# Altium footprint library NXP_60_26022015.PCBLIB: 287 footprints (part 13 of 18)
Each footprint in its own frame and in the unit in brackets; x right, y up, seen from the top. Pads: shape width x height; smd on the part's side, far side on the other; paste and mask are expansions set on the pad; w line width, h text height; cw(c..) or ccw(c..) is an arc to the next point about the centre after c.
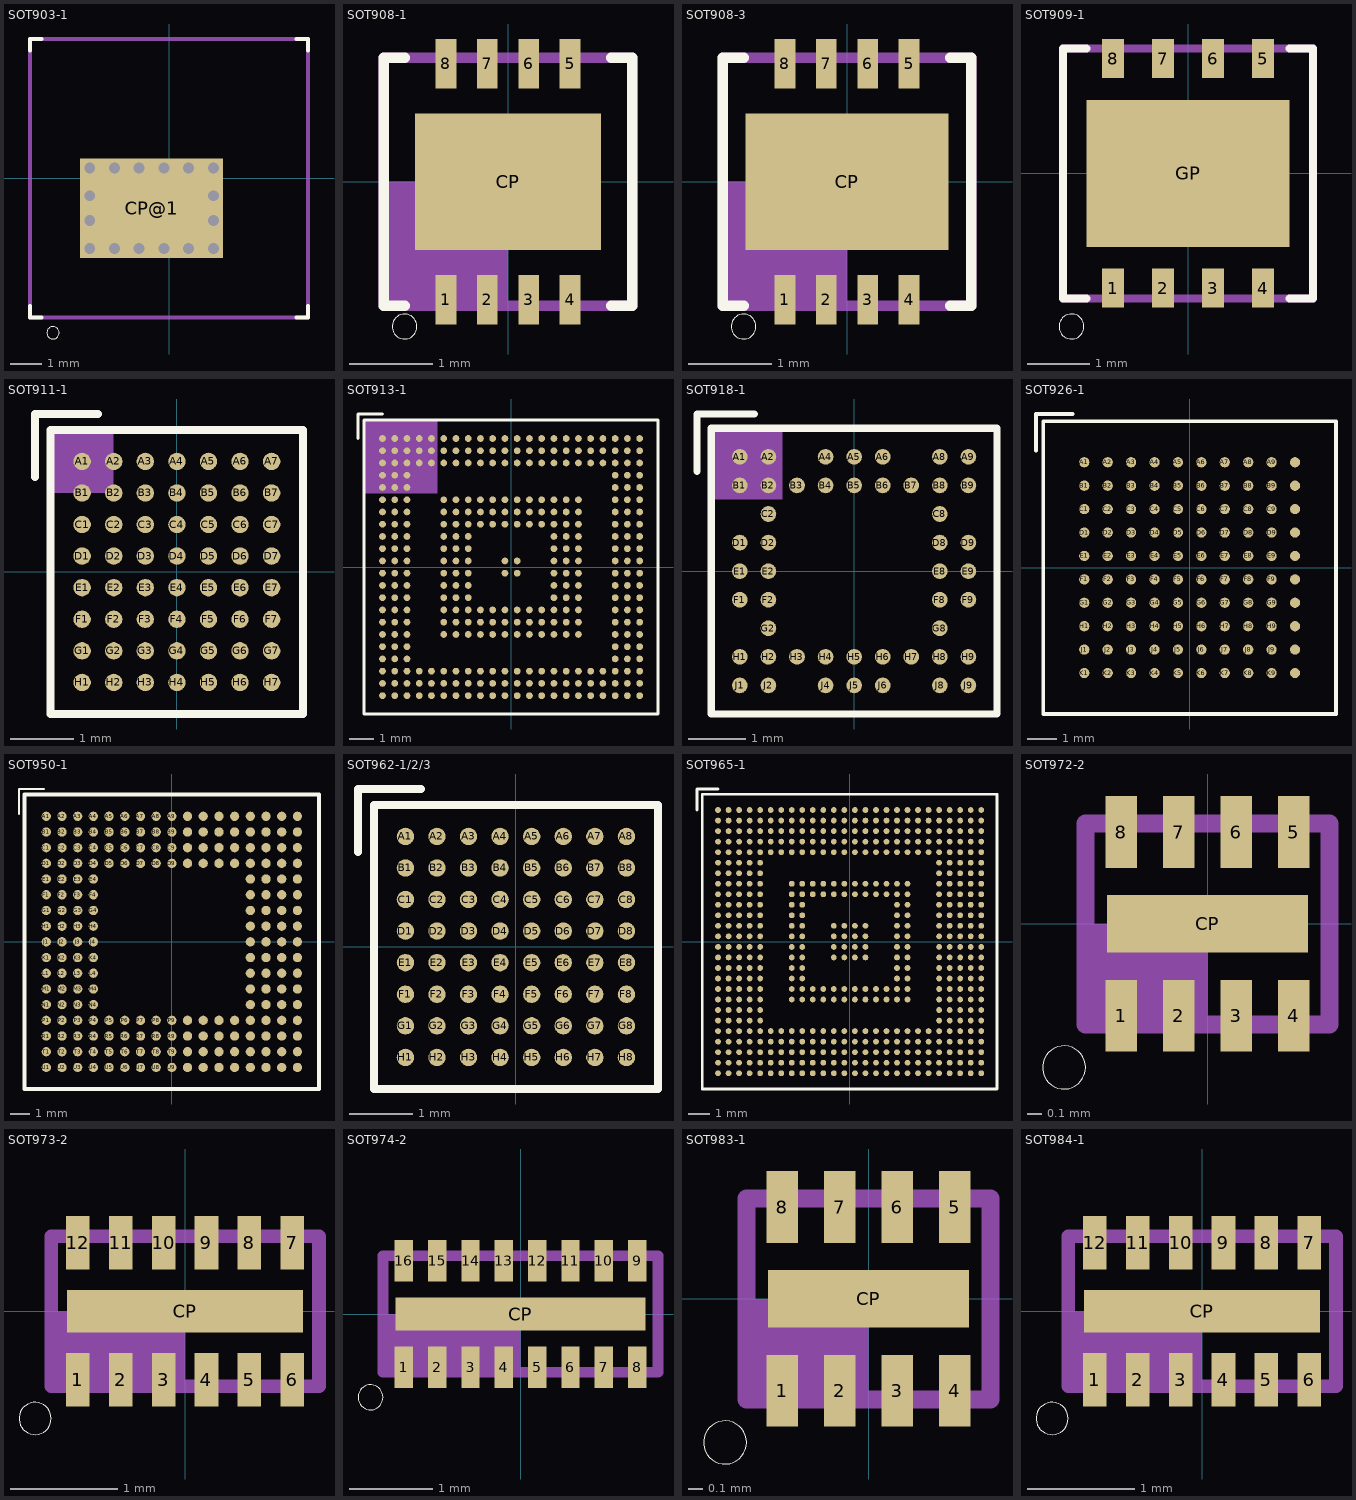
[diagram p12: the footprints below, top view; thin cyan lines are the x and y axes]

## SOT903-1 [mm]
pads (81):
  rect 0x0 smd: 1(-3.75,-4.25) 2(-3.25,-4.25) 3(-2.75,-4.25) 4(-2.25,-4.25) 5(-1.75,-4.25) 6(-1.25,-4.25) 7(-0.75,-4.25) 8(-0.25,-4.25) 9(0.25,-4.25) 10(0.75,-4.25) 11(1.25,-4.25) 12(1.75,-4.25) 13(2.25,-4.25) 14(2.75,-4.25) 15(3.25,-4.25) 16(3.75,-4.25) 17(4.25,-3.75) 18(4.25,-3.25) 19(4.25,-2.75) 20(4.25,-2.25) 21(4.25,-1.75) 22(4.25,-1.25) 23(4.25,-0.75) 24(4.25,-0.25) 25(4.25,0.25) 26(4.25,0.75) 27(4.25,1.25) 28(4.25,1.75) 29(4.25,2.25) 30(4.25,2.75) 31(4.25,3.25) 32(4.25,3.75) 33(3.75,4.25) 34(3.25,4.25) 35(2.75,4.25) 36(2.25,4.25) 37(1.75,4.25) 38(1.25,4.25) 39(0.75,4.25) 40(0.25,4.25) 41(-0.25,4.25) 42(-0.75,4.25) 43(-1.25,4.25) 44(-1.75,4.25) 45(-2.25,4.25) 46(-2.75,4.25) 47(-3.25,4.25) 48(-3.75,4.25) 49(-4.25,3.75) 50(-4.25,3.25) 51(-4.25,2.75) 52(-4.25,2.25) 53(-4.25,1.75) 54(-4.25,1.25) 55(-4.25,0.75) 56(-4.25,0.25) 57(-4.25,-0.25) 58(-4.25,-0.75) 59(-4.25,-1.25) 60(-4.25,-1.75) 61(-4.25,-2.25) 62(-4.25,-2.75) 63(-4.25,-3.25) 64(-4.25,-3.75)
  rect 4.61x3.22 smd: CP@1(-0.565,-0.97)
  round 0.5 hole 0.35: CP@2(1.435,-0.57) CP@3(1.435,-1.37) CP@4(1.435,-2.27) CP@5(1.435,0.33) CP@6(-2.565,-0.57) CP@7(-2.565,-1.37) CP@8(-2.565,-2.27) CP@9(-2.565,0.33) CP@10(-1.765,0.33) CP@11(-0.965,0.33) CP@12(-0.165,0.33) CP@13(0.635,0.33) CP@14(-1.765,-2.27) CP@15(-0.965,-2.27) CP@16(-0.165,-2.27) CP@17(0.635,-2.27)
Top Layer:
  region: 0,0 0.254,0 0.254,0.254 0,0.254
  region: 0,0 0.254,0 0.254,0.254 0,0.254
  region: 0,0 0.254,0 0.254,0.254 0,0.254
  region: 0,0 0.254,0 0.254,0.254 0,0.254
  region: 0,0 0.254,0 0.254,0.254 0,0.254
  region: 0,0 0.254,0 0.254,0.254 0,0.254
  region: 0,0 0.254,0 0.254,0.254 0,0.254
  region: 0,0 0.254,0 0.254,0.254 0,0.254
  region: 0,0 0.254,0 0.254,0.254 0,0.254
  region: 0,0 0.254,0 0.254,0.254 0,0.254
  region: 0,0 0.254,0 0.254,0.254 0,0.254
  region: 0,0 0.254,0 0.254,0.254 0,0.254
  region: 0,0 0.254,0 0.254,0.254 0,0.254
  region: 0,0 0.254,0 0.254,0.254 0,0.254
  region: 0,0 0.254,0 0.254,0.254 0,0.254
  region: 0,0 0.254,0 0.254,0.254 0,0.254
  region: 0,0 0.254,0 0.254,0.254 0,0.254
  region: 0,0 0.254,0 0.254,0.254 0,0.254
  region: 0,0 0.254,0 0.254,0.254 0,0.254
  region: 0,0 0.254,0 0.254,0.254 0,0.254
  region: 0,0 0.254,0 0.254,0.254 0,0.254
  region: 0,0 0.254,0 0.254,0.254 0,0.254
  region: 0,0 0.254,0 0.254,0.254 0,0.254
  region: 0,0 0.254,0 0.254,0.254 0,0.254
  region: 0,0 0.254,0 0.254,0.254 0,0.254
  region: 0,0 0.254,0 0.254,0.254 0,0.254
  region: 0,0 0.254,0 0.254,0.254 0,0.254
  region: 0,0 0.254,0 0.254,0.254 0,0.254
  region: 0,0 0.254,0 0.254,0.254 0,0.254
  region: 0,0 0.254,0 0.254,0.254 0,0.254
  region: 0,0 0.254,0 0.254,0.254 0,0.254
  region: 0,0 0.254,0 0.254,0.254 0,0.254
  region: 0,0 0.254,0 0.254,0.254 0,0.254
  region: 0,0 0.254,0 0.254,0.254 0,0.254
  region: 0,0 0.254,0 0.254,0.254 0,0.254
  region: 0,0 0.254,0 0.254,0.254 0,0.254
  region: 0,0 0.254,0 0.254,0.254 0,0.254
  region: 0,0 0.254,0 0.254,0.254 0,0.254
  region: 0,0 0.254,0 0.254,0.254 0,0.254
  region: 0,0 0.254,0 0.254,0.254 0,0.254
  region: 0,0 0.254,0 0.254,0.254 0,0.254
  region: 0,0 0.254,0 0.254,0.254 0,0.254
  region: 0,0 0.254,0 0.254,0.254 0,0.254
  region: 0,0 0.254,0 0.254,0.254 0,0.254
  region: 0,0 0.254,0 0.254,0.254 0,0.254
  region: 0,0 0.254,0 0.254,0.254 0,0.254
  region: 0,0 0.254,0 0.254,0.254 0,0.254
  region: 0,0 0.254,0 0.254,0.254 0,0.254
  region: 0,0 0.254,0 0.254,0.254 0,0.254
  region: 0,0 0.254,0 0.254,0.254 0,0.254
  region: 0,0 0.254,0 0.254,0.254 0,0.254
  region: 0,0 0.254,0 0.254,0.254 0,0.254
  region: 0,0 0.254,0 0.254,0.254 0,0.254
  region: 0,0 0.254,0 0.254,0.254 0,0.254
  region: 0,0 0.254,0 0.254,0.254 0,0.254
  region: 0,0 0.254,0 0.254,0.254 0,0.254
  region: 0,0 0.254,0 0.254,0.254 0,0.254
  region: 0,0 0.254,0 0.254,0.254 0,0.254
  region: 0,0 0.254,0 0.254,0.254 0,0.254
  region: 0,0 0.254,0 0.254,0.254 0,0.254
  region: 0,0 0.254,0 0.254,0.254 0,0.254
  region: 0,0 0.254,0 0.254,0.254 0,0.254
  region: 0,0 0.254,0 0.254,0.254 0,0.254
  region: 0,0 0.254,0 0.254,0.254 0,0.254
Top Overlay:
  circle w0: c-3.75,-5 r0.2
  lines w0.127: -4.5,-4.125 -4.5,-4.5 -4.125,-4.5 ; -4.5,4.125 -4.5,4.5 -4.125,4.5 ; 4.125,-4.5 4.5,-4.5 4.5,-4.125 ; 4.125,4.5 4.5,4.5 4.5,4.125
Top Paste:
  drawing of 70 lines, arcs and shapes, not listed
Top Solder:
  drawing of 65 lines, arcs and shapes, not listed
Mechanical 16:
  lines w0.127: -4.5,-4.5 4.5,-4.5 4.5,4.5 -4.5,4.5 -4.5,-4.5

## SOT908-1 [mm]
pads (9):
  rect 0.25x0.6 smd: 1(-0.75,-1.425) 2(-0.25,-1.425) 3(0.25,-1.425) 4(0.75,-1.425) 5(0.75,1.425) 6(0.25,1.425) 7(-0.25,1.425) 8(-0.75,1.425)
  rect 2.25x1.65 smd: CP(0,0)
Top Overlay:
  circle w0: c-1.25,-1.75 r0.15
  lines w0.127: -1.25,-1.5 -1.5,-1.5 -1.5,1.5 -1.25,1.5 ; 1.25,-1.5 1.5,-1.5 1.5,1.5 1.25,1.5
Top Paste:
  rectangle: -0.55,-0.325 0.55,0.325
Mechanical 16:
  rectangle: -1.5,-1.5 0,0
  lines w0.127: -1.5,-1.5 1.5,-1.5 1.5,1.5 -1.5,1.5 -1.5,-1.5

## SOT908-3 [mm]
pads (9):
  rect 0.25x0.6 smd: 1(-0.75,-1.425) 2(-0.25,-1.425) 3(0.25,-1.425) 4(0.75,-1.425) 5(0.75,1.425) 6(0.25,1.425) 7(-0.25,1.425) 8(-0.75,1.425)
  rect 2.45x1.65 smd: CP(0,0)
Top Overlay:
  circle w0: c-1.25,-1.75 r0.15
  lines w0.127: -1.25,-1.5 -1.5,-1.5 -1.5,1.5 -1.25,1.5 ; 1.25,-1.5 1.5,-1.5 1.5,1.5 1.25,1.5
Top Paste:
  rectangle: -0.55,-0.325 0.55,0.325
Mechanical 16:
  rectangle: -1.5,-1.5 0,0
  lines w0.127: -1.5,-1.5 1.5,-1.5 1.5,1.5 -1.5,1.5 -1.5,-1.5

## SOT909-1 [mm]
pads (9):
  rect 0.35x0.625 smd: 1(-1.2,-1.837) 2(-0.4,-1.837) 3(0.4,-1.837) 4(1.2,-1.837) 5(1.2,1.837) 6(0.4,1.837) 7(-0.4,1.837) 8(-1.2,1.837)
  rect 3.25x2.35 smd: GP(0,0)
Top Overlay:
  circle w0: c-1.865,-2.45 r0.2
  lines w0.127: -1.625,-2 -2,-2 -2,2 -1.625,2 ; 1.625,-2 2,-2 2,2 1.625,2
Top Paste:
  rectangle: 0.175,-0.55 0.875,0.55
  rectangle: -0.875,-0.55 -0.175,0.55
Mechanical 16:
  lines w0.127: -2,-2 2,-2 ; -2,2 2,2
  text "SOT909-1" at -0.5,-1.125 h0.17

## SOT911-1 [mm]
pads (56):
  rrect100% 0.275x0.275 smd: A1(-1.5,1.75) A2(-1,1.75) A3(-0.5,1.75) A4(0,1.75) A5(0.5,1.75) A6(1,1.75) A7(1.5,1.75) B1(-1.5,1.25) B2(-1,1.25) B3(-0.5,1.25) B4(0,1.25) B5(0.5,1.25) B6(1,1.25) B7(1.5,1.25) C1(-1.5,0.75) C2(-1,0.75) C3(-0.5,0.75) C4(0,0.75) C5(0.5,0.75) C6(1,0.75) C7(1.5,0.75) D1(-1.5,0.25) D2(-1,0.25) D3(-0.5,0.25) D4(0,0.25) D5(0.5,0.25) D6(1,0.25) D7(1.5,0.25) E1(-1.5,-0.25) E2(-1,-0.25) E3(-0.5,-0.25) E4(0,-0.25) E5(0.5,-0.25) E6(1,-0.25) E7(1.5,-0.25) F1(-1.5,-0.75) F2(-1,-0.75) F3(-0.5,-0.75) F4(0,-0.75) F5(0.5,-0.75) F6(1,-0.75) F7(1.5,-0.75) G1(-1.5,-1.25) G2(-1,-1.25) G3(-0.5,-1.25) G4(0,-1.25) G5(0.5,-1.25) G6(1,-1.25) G7(1.5,-1.25) H1(-1.5,-1.75) H2(-1,-1.75) H3(-0.5,-1.75) H4(0,-1.75) H5(0.5,-1.75) H6(1,-1.75) H7(1.5,-1.75)
Top Overlay:
  lines w0.127: -2.25,1.5 -2.25,2.5 -1.25,2.5 ; -2,-2.25 -2,2.25 2,2.25 2,-2.25 -2,-2.25
Top Paste:
  rectangle: -1.65,1.6 -1.35,1.9
  rectangle: -1.65,1.1 -1.35,1.4
  rectangle: -1.65,0.6 -1.35,0.9
  rectangle: -1.65,0.1 -1.35,0.4
  rectangle: -1.65,-0.4 -1.35,-0.1
  rectangle: -1.65,-0.9 -1.35,-0.6
  rectangle: -1.65,-1.4 -1.35,-1.1
  rectangle: -1.65,-1.9 -1.35,-1.6
  rectangle: -1.15,1.6 -0.85,1.9
  rectangle: -1.15,1.1 -0.85,1.4
  rectangle: -1.15,0.6 -0.85,0.9
  rectangle: -1.15,0.1 -0.85,0.4
  rectangle: -1.15,-0.4 -0.85,-0.1
  rectangle: -1.15,-0.9 -0.85,-0.6
  rectangle: -1.15,-1.4 -0.85,-1.1
  rectangle: -1.15,-1.9 -0.85,-1.6
  rectangle: -0.65,1.6 -0.35,1.9
  rectangle: -0.65,1.1 -0.35,1.4
  rectangle: -0.65,0.6 -0.35,0.9
  rectangle: -0.65,0.1 -0.35,0.4
  rectangle: -0.65,-0.4 -0.35,-0.1
  rectangle: -0.15,1.6 0.15,1.9
  rectangle: -0.15,1.1 0.15,1.4
  rectangle: -0.15,0.6 0.15,0.9
  rectangle: -0.15,0.1 0.15,0.4
  rectangle: 0.35,1.6 0.65,1.9
  rectangle: 0.35,1.1 0.65,1.4
  rectangle: 0.35,0.6 0.65,0.9
  rectangle: 0.35,0.1 0.65,0.4
  rectangle: -0.15,-0.4 0.15,-0.1
  rectangle: 0.35,-0.4 0.65,-0.1
  rectangle: -0.65,-0.9 -0.35,-0.6
  rectangle: -0.65,-1.4 -0.35,-1.1
  rectangle: -0.65,-1.9 -0.35,-1.6
  rectangle: -0.15,-0.9 0.15,-0.6
  rectangle: -0.15,-1.4 0.15,-1.1
  rectangle: -0.15,-1.9 0.15,-1.6
  rectangle: 0.35,-0.9 0.65,-0.6
  rectangle: 0.35,-1.4 0.65,-1.1
  rectangle: 0.35,-1.9 0.65,-1.6
  rectangle: 0.85,1.6 1.15,1.9
  rectangle: 0.85,1.1 1.15,1.4
  rectangle: 0.85,0.6 1.15,0.9
  rectangle: 0.85,0.1 1.15,0.4
  rectangle: 0.85,-0.4 1.15,-0.1
  rectangle: 0.85,-0.9 1.15,-0.6
  rectangle: 0.85,-1.4 1.15,-1.1
  rectangle: 0.85,-1.9 1.15,-1.6
  rectangle: 1.35,1.6 1.65,1.9
  rectangle: 1.35,1.1 1.65,1.4
  rectangle: 1.35,0.6 1.65,0.9
  rectangle: 1.35,0.1 1.65,0.4
  rectangle: 1.35,-0.4 1.65,-0.1
  rectangle: 1.35,-0.9 1.65,-0.6
  rectangle: 1.35,-1.4 1.65,-1.1
  rectangle: 1.35,-1.9 1.65,-1.6
Top Solder:
  circle w0: c-1.5,1.75 r0.213
  circle w0: c-1.5,1.25 r0.213
  circle w0: c-1.5,0.75 r0.213
  circle w0: c-1.5,0.25 r0.213
  circle w0: c-1.5,-0.25 r0.213
  circle w0: c-1.5,-0.75 r0.213
  circle w0: c-1.5,-1.25 r0.213
  circle w0: c-1.5,-1.75 r0.213
  circle w0: c-1,1.75 r0.213
  circle w0: c-1,1.25 r0.213
  circle w0: c-1,0.75 r0.213
  circle w0: c-1,0.25 r0.213
  circle w0: c-1,-0.25 r0.213
  circle w0: c-1,-0.75 r0.213
  circle w0: c-1,-1.25 r0.213
  circle w0: c-1,-1.75 r0.213
  circle w0: c-0.5,1.75 r0.213
  circle w0: c-0.5,1.25 r0.213
  circle w0: c-0.5,0.75 r0.213
  circle w0: c-0.5,0.25 r0.213
  circle w0: c-0.5,-0.25 r0.213
  circle w0: c0,1.75 r0.213
  circle w0: c0,1.25 r0.213
  circle w0: c0,0.75 r0.213
  circle w0: c0,0.25 r0.213
  circle w0: c0.5,1.75 r0.213
  circle w0: c0.5,1.25 r0.213
  circle w0: c0.5,0.75 r0.213
  circle w0: c0.5,0.25 r0.213
  circle w0: c0,-0.25 r0.213
  circle w0: c0.5,-0.25 r0.213
  circle w0: c-0.5,-0.75 r0.213
  circle w0: c-0.5,-1.25 r0.213
  circle w0: c-0.5,-1.75 r0.213
  circle w0: c0,-0.75 r0.213
  circle w0: c0,-1.25 r0.213
  circle w0: c0,-1.75 r0.213
  circle w0: c0.5,-0.75 r0.213
  circle w0: c0.5,-1.25 r0.213
  circle w0: c0.5,-1.75 r0.213
  circle w0: c1,1.75 r0.213
  circle w0: c1,1.25 r0.213
  circle w0: c1,0.75 r0.213
  circle w0: c1,0.25 r0.213
  circle w0: c1,-0.25 r0.213
  circle w0: c1,-0.75 r0.213
  circle w0: c1,-1.25 r0.213
  circle w0: c1,-1.75 r0.213
  circle w0: c1.5,1.75 r0.213
  circle w0: c1.5,1.25 r0.213
  circle w0: c1.5,0.75 r0.213
  circle w0: c1.5,0.25 r0.213
  circle w0: c1.5,-0.25 r0.213
  circle w0: c1.5,-0.75 r0.213
  circle w0: c1.5,-1.25 r0.213
  circle w0: c1.5,-1.75 r0.213
Mechanical 16:
  rectangle: -2,1.25 -1,2.25

## SOT913-1 [mm]
pads (340):
  rrect100% 0.275x0.275 smd: A1(-5.25,5.25) A2(-4.75,5.25) A3(-4.25,5.25) A4(-3.75,5.25) A5(-3.25,5.25) A6(-2.75,5.25) A7(-2.25,5.25) A8(-1.75,5.25) A9(-1.25,5.25) A10(-0.75,5.25) A11(-0.25,5.25) A12(0.25,5.25) A13(0.75,5.25) A14(1.25,5.25) A15(1.75,5.25) A16(2.25,5.25) A17(2.75,5.25) A18(3.25,5.25) A19(3.75,5.25) A20(4.25,5.25) A21(4.75,5.25) A22(5.25,5.25) AA1(-5.25,-4.75) AA2(-4.75,-4.75) AA3(-4.25,-4.75) AA4(-3.75,-4.75) AA5(-3.25,-4.75) AA6(-2.75,-4.75) AA7(-2.25,-4.75) AA8(-1.75,-4.75) AA9(-1.25,-4.75) AA10(-0.75,-4.75) AA11(-0.25,-4.75) AA12(0.25,-4.75) AA13(0.75,-4.75) AA14(1.25,-4.75) AA15(1.75,-4.75) AA16(2.25,-4.75) AA17(2.75,-4.75) AA18(3.25,-4.75) AA19(3.75,-4.75) AA20(4.25,-4.75) AA21(4.75,-4.75) AA22(5.25,-4.75) AB1(-5.25,-5.25) AB2(-4.75,-5.25) AB3(-4.25,-5.25) AB4(-3.75,-5.25) AB5(-3.25,-5.25) AB6(-2.75,-5.25) AB7(-2.25,-5.25) AB8(-1.75,-5.25) AB9(-1.25,-5.25) AB10(-0.75,-5.25) AB11(-0.25,-5.25) AB12(0.25,-5.25) AB13(0.75,-5.25) AB14(1.25,-5.25) AB15(1.75,-5.25) AB16(2.25,-5.25) AB17(2.75,-5.25) AB18(3.25,-5.25) AB19(3.75,-5.25) AB20(4.25,-5.25) AB21(4.75,-5.25) AB22(5.25,-5.25) B1(-5.25,4.75) B2(-4.75,4.75) B3(-4.25,4.75) B4(-3.75,4.75) B5(-3.25,4.75) B6(-2.75,4.75) B7(-2.25,4.75) B8(-1.75,4.75) B9(-1.25,4.75) B10(-0.75,4.75) B11(-0.25,4.75) B12(0.25,4.75) B13(0.75,4.75) B14(1.25,4.75) B15(1.75,4.75) B16(2.25,4.75) B17(2.75,4.75) B18(3.25,4.75) B19(3.75,4.75) B20(4.25,4.75) B21(4.75,4.75) B22(5.25,4.75) C1(-5.25,4.25) C2(-4.75,4.25) C3(-4.25,4.25) C4(-3.75,4.25) C5(-3.25,4.25) C6(-2.75,4.25) C7(-2.25,4.25) C8(-1.75,4.25) C9(-1.25,4.25) C10(-0.75,4.25) C11(-0.25,4.25) C12(0.25,4.25) C13(0.75,4.25) C14(1.25,4.25) C15(1.75,4.25) C16(2.25,4.25) C17(2.75,4.25) C18(3.25,4.25) C19(3.75,4.25) C20(4.25,4.25) C21(4.75,4.25) C22(5.25,4.25) D1(-5.25,3.75) D2(-4.75,3.75) D3(-4.25,3.75) D20(4.25,3.75) D21(4.75,3.75) D22(5.25,3.75) E1(-5.25,3.25) E2(-4.75,3.25) E3(-4.25,3.25) E20(4.25,3.25) E21(4.75,3.25) E22(5.25,3.25) F1(-5.25,2.75) F2(-4.75,2.75) F3(-4.25,2.75) F6(-2.75,2.75) F7(-2.25,2.75) F8(-1.75,2.75) F9(-1.25,2.75) F10(-0.75,2.75) F11(-0.25,2.75) F12(0.25,2.75) F13(0.75,2.75) F14(1.25,2.75) F15(1.75,2.75) F16(2.25,2.75) F17(2.75,2.75) F20(4.25,2.75) F21(4.75,2.75) F22(5.25,2.75) G1(-5.25,2.25) G2(-4.75,2.25) G3(-4.25,2.25) G6(-2.75,2.25) G7(-2.25,2.25) G8(-1.75,2.25) G9(-1.25,2.25) G10(-0.75,2.25) G11(-0.25,2.25) G12(0.25,2.25) G13(0.75,2.25) G14(1.25,2.25) G15(1.75,2.25) G16(2.25,2.25) G17(2.75,2.25) G20(4.25,2.25) G21(4.75,2.25) G22(5.25,2.25) H1(-5.25,1.75) H2(-4.75,1.75) H3(-4.25,1.75) H6(-2.75,1.75) H7(-2.25,1.75) H8(-1.75,1.75) H9(-1.25,1.75) H10(-0.75,1.75) H11(-0.25,1.75) H12(0.25,1.75) H13(0.75,1.75) H14(1.25,1.75) H15(1.75,1.75) H16(2.25,1.75) H17(2.75,1.75) H20(4.25,1.75) H21(4.75,1.75) H22(5.25,1.75) J1(-5.25,1.25) J2(-4.75,1.25) J3(-4.25,1.25) J6(-2.75,1.25) J7(-2.25,1.25) J8(-1.75,1.25) J15(1.75,1.25) J16(2.25,1.25) J17(2.75,1.25) J20(4.25,1.25) J21(4.75,1.25) J22(5.25,1.25) K1(-5.25,0.75) K2(-4.75,0.75) K3(-4.25,0.75) K6(-2.75,0.75) K7(-2.25,0.75) K8(-1.75,0.75) K15(1.75,0.75) K16(2.25,0.75) K17(2.75,0.75) K20(4.25,0.75) K21(4.75,0.75) K22(5.25,0.75) L1(-5.25,0.25) L2(-4.75,0.25) L3(-4.25,0.25) L6(-2.75,0.25) L7(-2.25,0.25) L8(-1.75,0.25) L11(-0.25,0.25) L12(0.25,0.25) L15(1.75,0.25) L16(2.25,0.25) L17(2.75,0.25) L20(4.25,0.25) L21(4.75,0.25) L22(5.25,0.25) M1(-5.25,-0.25) M2(-4.75,-0.25) M3(-4.25,-0.25) M6(-2.75,-0.25) M7(-2.25,-0.25) M8(-1.75,-0.25) M11(-0.25,-0.25) M12(0.25,-0.25) M15(1.75,-0.25) M16(2.25,-0.25) M17(2.75,-0.25) M20(4.25,-0.25) M21(4.75,-0.25) M22(5.25,-0.25) N1(-5.25,-0.75) N2(-4.75,-0.75) N3(-4.25,-0.75) N6(-2.75,-0.75) N7(-2.25,-0.75) N8(-1.75,-0.75) N15(1.75,-0.75) N16(2.25,-0.75) N17(2.75,-0.75) N20(4.25,-0.75) N21(4.75,-0.75) N22(5.25,-0.75) P1(-5.25,-1.25) P2(-4.75,-1.25) P3(-4.25,-1.25) P6(-2.75,-1.25) P7(-2.25,-1.25) P8(-1.75,-1.25) P15(1.75,-1.25) P16(2.25,-1.25) P17(2.75,-1.25) P20(4.25,-1.25) P21(4.75,-1.25) P22(5.25,-1.25) R1(-5.25,-1.75) R2(-4.75,-1.75) R3(-4.25,-1.75) R6(-2.75,-1.75) R7(-2.25,-1.75) R8(-1.75,-1.75) R9(-1.25,-1.75) R10(-0.75,-1.75) R11(-0.25,-1.75) R12(0.25,-1.75) R13(0.75,-1.75) R14(1.25,-1.75) R15(1.75,-1.75) R16(2.25,-1.75) R17(2.75,-1.75) R20(4.25,-1.75) R21(4.75,-1.75) R22(5.25,-1.75) T1(-5.25,-2.25) T2(-4.75,-2.25) T3(-4.25,-2.25) T6(-2.75,-2.25) T7(-2.25,-2.25) T8(-1.75,-2.25) T9(-1.25,-2.25) T10(-0.75,-2.25) T11(-0.25,-2.25) T12(0.25,-2.25) T13(0.75,-2.25) T14(1.25,-2.25) T15(1.75,-2.25) T16(2.25,-2.25) T17(2.75,-2.25) T20(4.25,-2.25) T21(4.75,-2.25) T22(5.25,-2.25) U1(-5.25,-2.75) U2(-4.75,-2.75) U3(-4.25,-2.75) U6(-2.75,-2.75) U7(-2.25,-2.75) U8(-1.75,-2.75) U9(-1.25,-2.75) U10(-0.75,-2.75) U11(-0.25,-2.75) U12(0.25,-2.75) U13(0.75,-2.75) U14(1.25,-2.75) U15(1.75,-2.75) U16(2.25,-2.75) U17(2.75,-2.75) U20(4.25,-2.75) U21(4.75,-2.75) U22(5.25,-2.75) V1(-5.25,-3.25) V2(-4.75,-3.25) V3(-4.25,-3.25) V20(4.25,-3.25) V21(4.75,-3.25) V22(5.25,-3.25) W1(-5.25,-3.75) W2(-4.75,-3.75) W3(-4.25,-3.75) W20(4.25,-3.75) W21(4.75,-3.75) W22(5.25,-3.75) Y1(-5.25,-4.25) Y2(-4.75,-4.25) Y3(-4.25,-4.25) Y4(-3.75,-4.25) Y5(-3.25,-4.25) Y6(-2.75,-4.25) Y7(-2.25,-4.25) Y8(-1.75,-4.25) Y9(-1.25,-4.25) Y10(-0.75,-4.25) Y11(-0.25,-4.25) Y12(0.25,-4.25) Y13(0.75,-4.25) Y14(1.25,-4.25) Y15(1.75,-4.25) Y16(2.25,-4.25) Y17(2.75,-4.25) Y18(3.25,-4.25) Y19(3.75,-4.25) Y20(4.25,-4.25) Y21(4.75,-4.25) Y22(5.25,-4.25)
Top Overlay:
  lines w0.127: -6.25,5.25 -6.25,6.25 -5.25,6.25 ; -6,-6 -6,6 6,6 6,-6 -6,-6
Top Paste:
  drawing of 340 lines, arcs and shapes, not listed
Top Solder:
  drawing of 340 lines, arcs and shapes, not listed
Mechanical 16:
  rectangle: -6,3 -3,6

## SOT918-1 [mm]
pads (48):
  rrect100% 0.275x0.275 smd: A1(-2,2) A2(-1.5,2) A4(-0.5,2) A5(0,2) A6(0.5,2) A8(1.5,2) A9(2,2) B1(-2,1.5) B2(-1.5,1.5) B3(-1,1.5) B4(-0.5,1.5) B5(0,1.5) B6(0.5,1.5) B7(1,1.5) B8(1.5,1.5) B9(2,1.5) C2(-1.5,1) C8(1.5,1) D1(-2,0.5) D2(-1.5,0.5) D8(1.5,0.5) D9(2,0.5) E1(-2,0) E2(-1.5,0) E8(1.5,0) E9(2,0) F1(-2,-0.5) F2(-1.5,-0.5) F8(1.5,-0.5) F9(2,-0.5) G2(-1.5,-1) G8(1.5,-1) H1(-2,-1.5) H2(-1.5,-1.5) H3(-1,-1.5) H4(-0.5,-1.5) H5(0,-1.5) H6(0.5,-1.5) H7(1,-1.5) H8(1.5,-1.5) H9(2,-1.5) J1(-2,-2) J2(-1.5,-2) J4(-0.5,-2) J5(0,-2) J6(0.5,-2) J8(1.5,-2) J9(2,-2)
Top Overlay:
  lines w0.127: -2.75,1.75 -2.75,2.75 -1.75,2.75 ; -2.5,-2.5 -2.5,2.5 2.5,2.5 2.5,-2.5 -2.5,-2.5
Top Paste:
  rectangle: -1.15,-1.65 -0.85,-1.35
  rectangle: -2.15,1.85 -1.85,2.15
  rectangle: -1.65,1.85 -1.35,2.15
  rectangle: -2.15,1.35 -1.85,1.65
  rectangle: -1.65,1.35 -1.35,1.65
  rectangle: -1.65,0.85 -1.35,1.15
  rectangle: -2.15,0.35 -1.85,0.65
  rectangle: -1.65,0.35 -1.35,0.65
  rectangle: -2.15,-0.15 -1.85,0.15
  rectangle: -1.65,-0.15 -1.35,0.15
  rectangle: -2.15,-0.65 -1.85,-0.35
  rectangle: -1.65,-0.65 -1.35,-0.35
  rectangle: -1.65,-1.15 -1.35,-0.85
  rectangle: -2.15,-1.65 -1.85,-1.35
  rectangle: -1.65,-1.65 -1.35,-1.35
  rectangle: -2.15,-2.15 -1.85,-1.85
  rectangle: -1.15,1.35 -0.85,1.65
  rectangle: -0.65,1.85 -0.35,2.15
  rectangle: -0.65,-1.65 -0.35,-1.35
  rectangle: -0.15,-1.65 0.15,-1.35
  rectangle: 0.35,-1.65 0.65,-1.35
  rectangle: 1.35,0.35 1.65,0.65
  rectangle: 1.85,0.35 2.15,0.65
  rectangle: -0.65,1.35 -0.35,1.65
  rectangle: -0.15,1.35 0.15,1.65
  rectangle: 0.35,1.35 0.65,1.65
  rectangle: 0.85,1.35 1.15,1.65
  rectangle: -0.15,1.85 0.15,2.15
  rectangle: 0.35,1.85 0.65,2.15
  rectangle: 1.35,1.85 1.65,2.15
  rectangle: 1.85,1.85 2.15,2.15
  rectangle: 1.35,1.35 1.65,1.65
  rectangle: 1.85,1.35 2.15,1.65
  rectangle: 1.35,-0.15 1.65,0.15
  rectangle: 1.85,-0.15 2.15,0.15
  rectangle: 1.35,-0.65 1.65,-0.35
  rectangle: 1.85,-0.65 2.15,-0.35
  rectangle: 1.35,-1.65 1.65,-1.35
  rectangle: 1.85,-1.65 2.15,-1.35
  rectangle: 1.35,-2.15 1.65,-1.85
  rectangle: 1.85,-2.15 2.15,-1.85
  rectangle: -0.15,-2.15 0.15,-1.85
  rectangle: 0.35,-2.15 0.65,-1.85
  rectangle: 0.85,-1.65 1.15,-1.35
  rectangle: 1.35,-1.15 1.65,-0.85
  rectangle: -1.65,-2.15 -1.35,-1.85
  rectangle: -0.65,-2.15 -0.35,-1.85
  rectangle: 1.35,0.85 1.65,1.15
Top Solder:
  circle w0: c-1,-1.5 r0.213
  circle w0: c-2,2 r0.213
  circle w0: c-1.5,2 r0.213
  circle w0: c-2,1.5 r0.213
  circle w0: c-1.5,1.5 r0.213
  circle w0: c-1.5,1 r0.213
  circle w0: c-2,0.5 r0.213
  circle w0: c-1.5,0.5 r0.213
  circle w0: c-2,0 r0.213
  circle w0: c-1.5,0 r0.213
  circle w0: c-2,-0.5 r0.213
  circle w0: c-1.5,-0.5 r0.213
  circle w0: c-1.5,-1 r0.213
  circle w0: c-2,-1.5 r0.213
  circle w0: c-1.5,-1.5 r0.213
  circle w0: c-2,-2 r0.213
  circle w0: c-1,1.5 r0.213
  circle w0: c-0.5,2 r0.213
  circle w0: c-0.5,-1.5 r0.213
  circle w0: c0,-1.5 r0.213
  circle w0: c0.5,-1.5 r0.213
  circle w0: c1.5,0.5 r0.213
  circle w0: c2,0.5 r0.213
  circle w0: c-0.5,1.5 r0.213
  circle w0: c0,1.5 r0.213
  circle w0: c0.5,1.5 r0.213
  circle w0: c1,1.5 r0.213
  circle w0: c0,2 r0.213
  circle w0: c0.5,2 r0.213
  circle w0: c1.5,2 r0.213
  circle w0: c2,2 r0.213
  circle w0: c1.5,1.5 r0.213
  circle w0: c2,1.5 r0.213
  circle w0: c1.5,0 r0.213
  circle w0: c2,0 r0.213
  circle w0: c1.5,-0.5 r0.213
  circle w0: c2,-0.5 r0.213
  circle w0: c1.5,-1.5 r0.213
  circle w0: c2,-1.5 r0.213
  circle w0: c1.5,-2 r0.213
  circle w0: c2,-2 r0.213
  circle w0: c0,-2 r0.213
  circle w0: c0.5,-2 r0.213
  circle w0: c1,-1.5 r0.213
  circle w0: c1.5,-1 r0.213
  circle w0: c-1.5,-2 r0.213
  circle w0: c-0.5,-2 r0.213
  circle w0: c1.5,1 r0.213
Mechanical 16:
  region: -2.5,2.5 -2.5,1.25 -1.25,1.25 -1.25,2.5
  text "SOT918-1" at -0.75,-0.125 h0.17
